# Altium footprint library MyPcb.PcbLib: 367 footprints (part 16 of 23)
Each footprint in its own frame and in the unit in brackets; x right, y up, seen from the top. Pads: shape width x height; smd on the part's side, far side on the other; paste and mask are expansions set on the pad; w line width, h text height; cw(c..) or ccw(c..) is an arc to the next point about the centre after c.
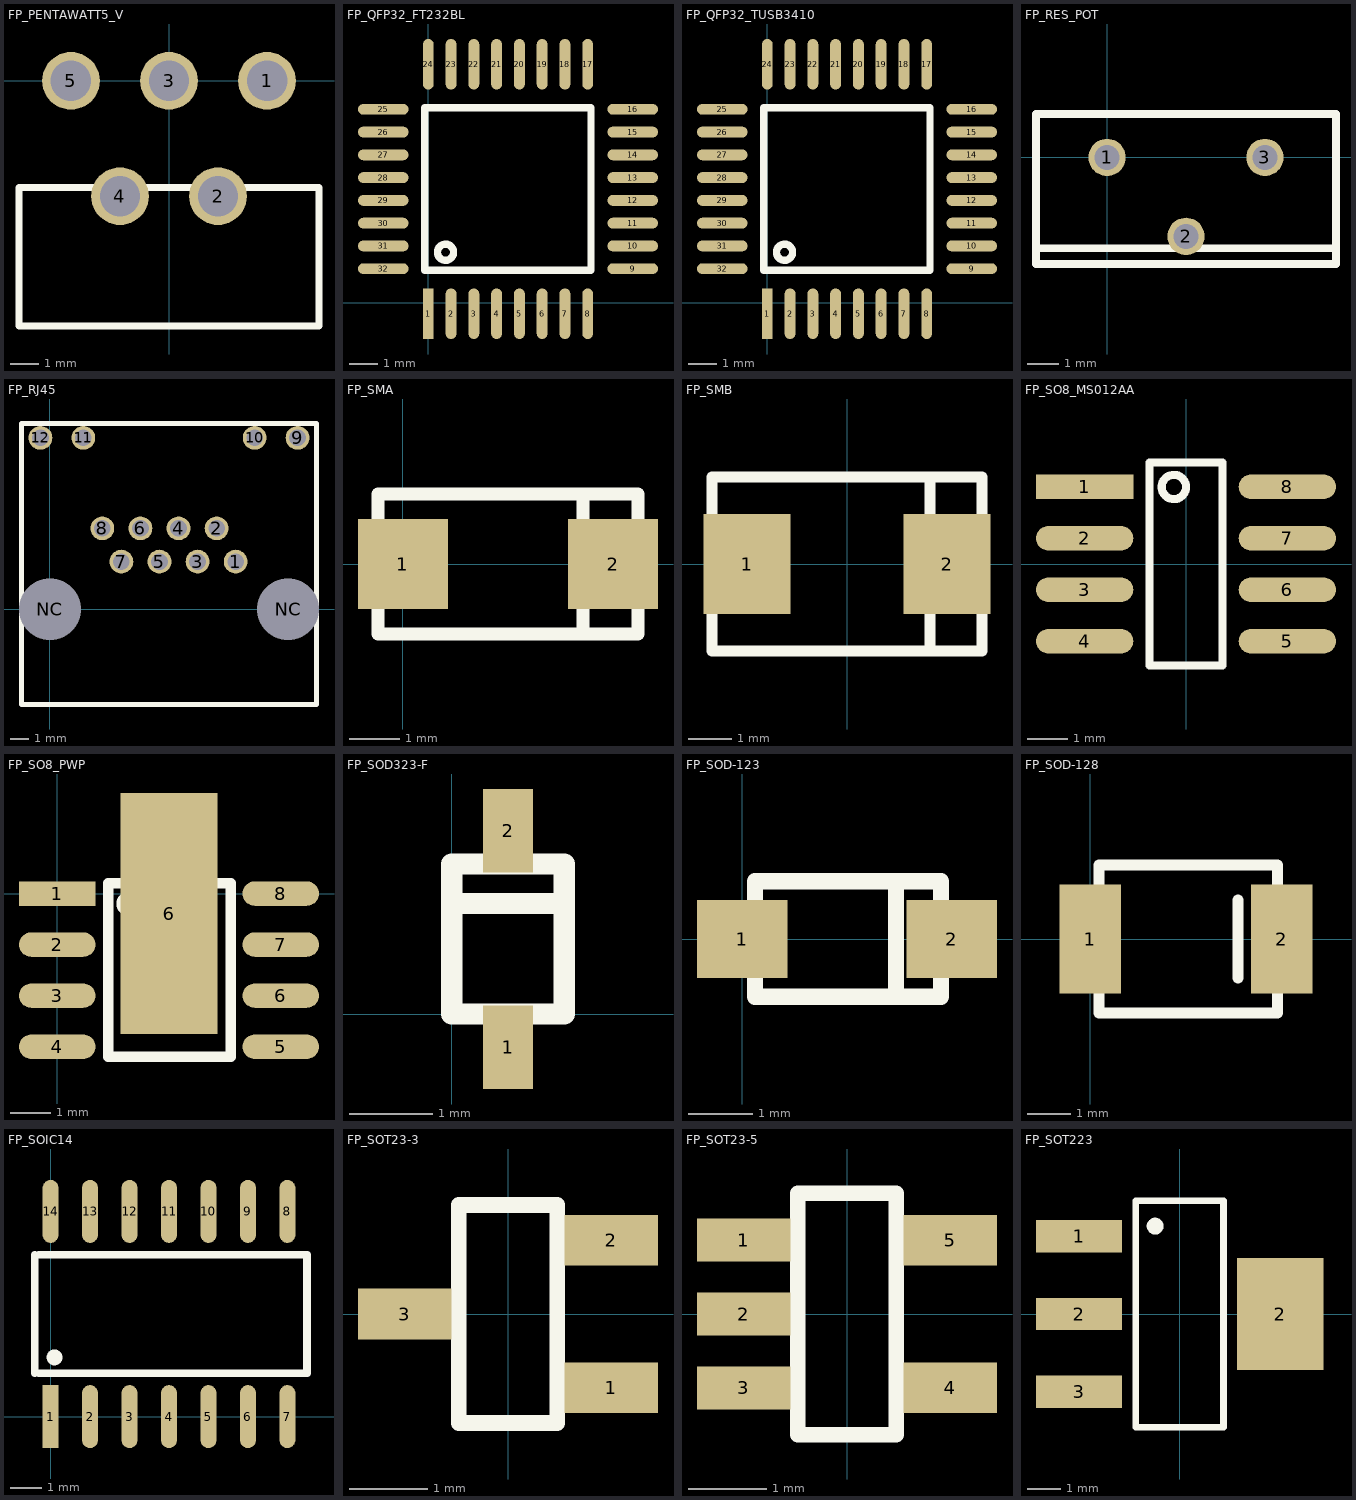
[diagram p15: the footprints below, top view; thin cyan lines are the x and y axes]

## FP_PENTAWATT5_V [mm] "Pentawatt 5 lead trough hole, vertical mount"
height 21.15
pads (5):
  round 2 hole 1.4: 1(3.4,0) 2(1.7,-4) 3(0,0) 4(-1.7,-4) 5(-3.4,0)
Top Overlay:
  lines w0.254: -5.2,-8.5 -5.2,-3.7 5.2,-3.7 5.2,-8.5 -5.2,-8.5
3D body "PENTAWATT5.STEP": height 21.08, standoff -4.22, extent -5.2,-7.9 5.2,0.174

## FP_QFP32_FT232BL [mil] "FTDI USB-UART atalakito"
height 62.99
pads (32):
  rect 15x70 smd: 1(0,-15)
  oval 15x70 smd: 2(31.5,-15) 3(62.99,-15) 4(94.49,-15) 5(125.98,-15) 6(157.48,-15) 7(188.98,-15) 8(220.47,-15) 17(220.47,329.96) 18(188.98,329.96) 19(157.48,329.96) 20(125.98,329.96) 21(94.49,329.96) 22(62.99,329.96) 23(31.5,329.96) 24(0,329.96)
  oval 70x15 smd paste+0: 9(282.72,47.24) 10(282.72,78.74) 11(282.72,110.24) 12(282.72,141.73) 13(282.72,173.23) 14(282.72,204.72) 15(282.72,236.22) 16(282.72,267.72)
  oval 70x15 smd: 25(-62.24,267.72) 26(-62.24,236.22) 27(-62.24,204.72) 28(-62.24,173.23) 29(-62.24,141.73) 30(-62.24,110.24) 31(-62.24,78.74) 32(-62.24,47.24)
Top Overlay:
  circle w10: c23.82,70 r11.18
  lines w10: -5,45 -5,270 225,270 225,45 -5,45
3D body "QFP32_ST-32-2.STEP": height 68.9, standoff 0, extent -67.35,-20.09 287.81,335.06

## FP_QFP32_TUSB3410 [mil] "TI TUSB3410 USB-UART atalakito MO-135 tok"
height 57.09
pads (32):
  rect 15x70 smd: 1(0,-15)
  oval 15x70 smd: 2(31.5,-15) 3(62.99,-15) 4(94.49,-15) 5(125.98,-15) 6(157.48,-15) 7(188.98,-15) 8(220.47,-15) 17(220.47,329.96) 18(188.98,329.96) 19(157.48,329.96) 20(125.98,329.96) 21(94.49,329.96) 22(62.99,329.96) 23(31.5,329.96) 24(0,329.96)
  oval 70x15 smd paste+0: 9(282.72,47.24) 10(282.72,78.74) 11(282.72,110.24) 12(282.72,141.73) 13(282.72,173.23) 14(282.72,204.72) 15(282.72,236.22) 16(282.72,267.72)
  oval 70x15 smd: 25(-62.24,267.72) 26(-62.24,236.22) 27(-62.24,204.72) 28(-62.24,173.23) 29(-62.24,141.73) 30(-62.24,110.24) 31(-62.24,78.74) 32(-62.24,47.24)
Top Overlay:
  circle w10: c23.82,70 r11.18
  lines w10: -5,45 225,45 225,270 -5,270 -5,45
3D body "QFP32_MO-135.STEP": height 62.99, standoff 0, extent -67.35,-20.09 287.81,335.06

## FP_RES_POT [mm] "BOURNS - 3386H-1-103LF - TRIMMER, 10K"
height 9.525
pads (3):
  round 1.2 hole 0.8: 1(0,0) 2(2.54,-2.54) 3(5.08,0)
Top Overlay:
  lines w0.254: -2.286,-2.921 7.366,-2.921 ; -2.286,-3.429 7.366,-3.429 7.366,1.397 -2.286,1.397 -2.286,-3.429
3D body: height 9.53, standoff 0, extent -1.777,-3.441 7.873,1.409
3D body: height 6.93, standoff 3.73, extent 0.946,-3.55 4.134,-3.45
3D body: height 0, standoff -2, extent -0.4,-0.4 0.397,0.398
3D body: height 0, standoff -2, extent 4.68,-0.4 5.477,0.398
3D body: height 0, standoff -2, extent 2.14,-2.94 2.937,-2.142

## FP_RJ45 [mil] "AMPHENOL RJHS-508X"
height 520
pads (14):
  round 50 hole 35: 1(390,100) 2(350,170) 3(310,100) 4(270,170) 5(230,100) 6(190,170) 7(150,100) 8(110,170) 9(520,360) 10(430,360) 11(70,360) 12(-20,360)
  round 110 hole 130 unplated: NC(0,0) NC(500,0)
Top Overlay:
  lines w10: -60,-200 560,-200 560,390 -60,390 -60,-200
3D body "RJ45_rjhs5384-amphenol.STEP": height 580.87, standoff -144.88, extent -78.88,-234.77 579,405

## FP_SMA [mm] "SMA DO-214AC tok"
height 2.2
pads (2):
  rect 1.8x1.8 smd: 1(0,0) 2(4.2,0)
Top Overlay:
  lines w0.254: 3.6,-1.4 3.6,1.4 ; -0.5,-1.4 4.7,-1.4 4.7,1.4 -0.5,1.4 -0.5,-1.4
3D body "SMA.STEP": height 2.42, standoff 0.02, extent -0.5,-1.3 4.7,1.3

## FP_SMB [mm] "DO214-AA tok (SMB)"
height 2.5
pads (2):
  rect 2x2.3 smd: 1(-2.3,0) 2(2.3,0)
Top Overlay:
  lines w0.254: 1.905,-2 1.905,2 ; 3.1,2 -3.1,2 -3.1,-2 3.1,-2 3.1,2 ; 3.1,2 3.1,2
3D body "DO-214AA SMB.STEP": height 2.32, standoff 0.02, extent -2.7,-1.8 2.7,1.8

## FP_SO8_MS012AA [mm] "SO8 JEDEC MS-012AA, Analog Devices R-8, SO8-SOT96-1, NS M08A"
height 1.75
pads (8):
  rect 2.4x0.6 smd: 1(-2.5,1.905)
  oval 2.4x0.6 smd: 2(-2.5,0.635) 3(-2.5,-0.635) 4(-2.5,-1.905) 5(2.5,-1.905) 6(2.5,-0.635) 7(2.5,0.635) 8(2.5,1.905)
Top Overlay:
  circle w0.2: c-0.3,1.9 r0.3
  lines w0.2: -0.9,-2.5 -0.9,2.5 0.9,2.5 0.9,-2.5 -0.9,-2.5
3D body "SO8_MS012AA.STEP": height 1.9, standoff 0, extent -3.028,-2.5 3.028,2.5

## FP_SO8_PWP [mil] "SOIC8 powerpad tok"
height 78.74
pads (9):
  rect 75x24 smd: 1(0,0)
  oval 75x24 smd: 2(0,-50) 3(0,-100) 4(0,-150) 5(219,-150) 6(219,-100) 7(219,-50) 8(219,0)
  rect 94.88x236.22 smd: 6(109.53,-19.68)
Top Overlay:
  circle w10: c70,-10 r7.07
  lines w10: 50,-160 169.94,-160 169.94,10 50.06,10 50.06,-129.94 50,-130 50,-160
3D body "SOIC-8.STEP": height 68.9, standoff 0.01, extent -8.1,-173.23 228.58,23.62

## FP_SOD323-F [mm] "SOD323-F (SC-90)"
height 0.8
pads (2):
  rect 0.6x1 smd: 1(0.675,-0.4) 2(0.675,2.2)
Top Overlay:
  lines w0.254: 0,1.325 1.35,1.325 ; 0,0 0,1.8 1.35,1.8 1.35,0 0,0
3D body "SOD-323F.STEP": height 0.79, standoff -0.08, extent 0.022,-0.461 1.372,2.239

## FP_SOD-123 [mm]
height 1.168
pads (2):
  rect 1.41x1.22 smd: 1(0,0) 2(3.27,0)
Top Overlay:
  lines w0.254: 2.4,-0.9 2.4,0.9 ; 0.2,-0.9 3.1,-0.9 3.1,0.9 0.2,0.9 0.2,-0.9
3D body "SOD-123_DiodesInc.STEP": height 1.47, standoff 0.02, extent -0.3,-0.85 3.55,0.85

## FP_SOD-128 [mm]
height 1.168
pads (2):
  rect 1.41x2.5 smd: 1(0,0) 2(4.4,0)
Top Overlay:
  lines w0.254: 3.4,-0.9 3.4,0.9 ; 0.2,-1.7 4.3,-1.7 4.3,1.7 0.2,1.7 0.2,-1.7
3D body: height 1.1, standoff 0, extent 0.1,-1.3 4.2,1.4

## FP_SOIC14 [mil] "SOIC-14 egyesek szerint narrow, RET szerint normál"
height 69
pads (14):
  rect 20x80 smd: 1(0,0)
  oval 20x80 smd: 2(50,0) 3(100,0) 4(150,0) 5(200,0) 6(250,0) 7(300,0) 8(300,260) 9(250,260) 10(200,260) 11(150,260) 12(100,260) 13(50,260) 14(0,260)
Top Overlay:
  circle w10: c5,75 r5
  lines w10: -20,55 -20,205 ; -15,55 325,55 325,205 -15,205
3D body "SOIC14N.STEP": height 62.99, standoff 0, extent -22.25,9.8 322.24,248.21

## FP_SOT23-3 [mm] "SOT23-3 tok"
height 1.1
pads (3):
  rect 1.2x0.65 smd: 1(1.327,-0.95) 2(1.327,0.95) 3(-1.327,0)
Top Overlay:
  lines w0.2: -0.635,-1.4 -0.635,1.4 0.635,1.4 0.635,-1.4 -0.635,-1.4
3D body "SOT-23.STEP": height 0.97, standoff -0.01, extent -1.274,-1.46 1.274,1.46

## FP_SOT23-5 [mm] "SOT23, 5-Leads, Body 2.9x1.6mm, Pitch 0.95mm, Lead Span 2.8mm, IPC Medium Density"
height 1.19
pads (5):
  rect 1.2x0.55 smd mask+0.05: 1(-1.327,0.95) 2(-1.327,0) 3(-1.327,-0.95)
  rect 1.2x0.65 smd: 4(1.327,-0.95) 5(1.327,0.95)
Top Overlay:
  lines w0.2: -0.635,-1.55 0.635,-1.55 0.635,1.55 -0.635,1.55 -0.635,-1.55
3D body "SOT-23-5.STEP": height 1, standoff 0, extent -1.17,-1.46 1.17,1.46

## FP_SOT223 [mm] "SOT223 package, 3 leads"
height 1.8
pads (4):
  rect 2.55x0.95 smd: 1(-2.975,2.3) 2(-2.975,0) 3(-2.975,-2.3)
  rect 2.55x3.3 smd: 2(2.975,0)
Top Overlay:
  circle w0.25: c-0.725,2.6 r0.125
  lines w0.2: -1.3,-3.35 1.3,-3.35 1.3,3.35 -1.3,3.35 -1.3,-3.35
3D body "SOT-223-1.STEP": height 1.65, standoff 0, extent -3.5,-3.25 3.5,3.25